# Altium footprint library SparkFun.PCBLIB: 674 footprints (part 38 of 44)
Each footprint in its own frame and in the unit in brackets; x right, y up, seen from the top. Pads: shape width x height; smd on the part's side, far side on the other; paste and mask are expansions set on the pad; w line width, h text height; cw(c..) or ccw(c..) is an arc to the next point about the centre after c.
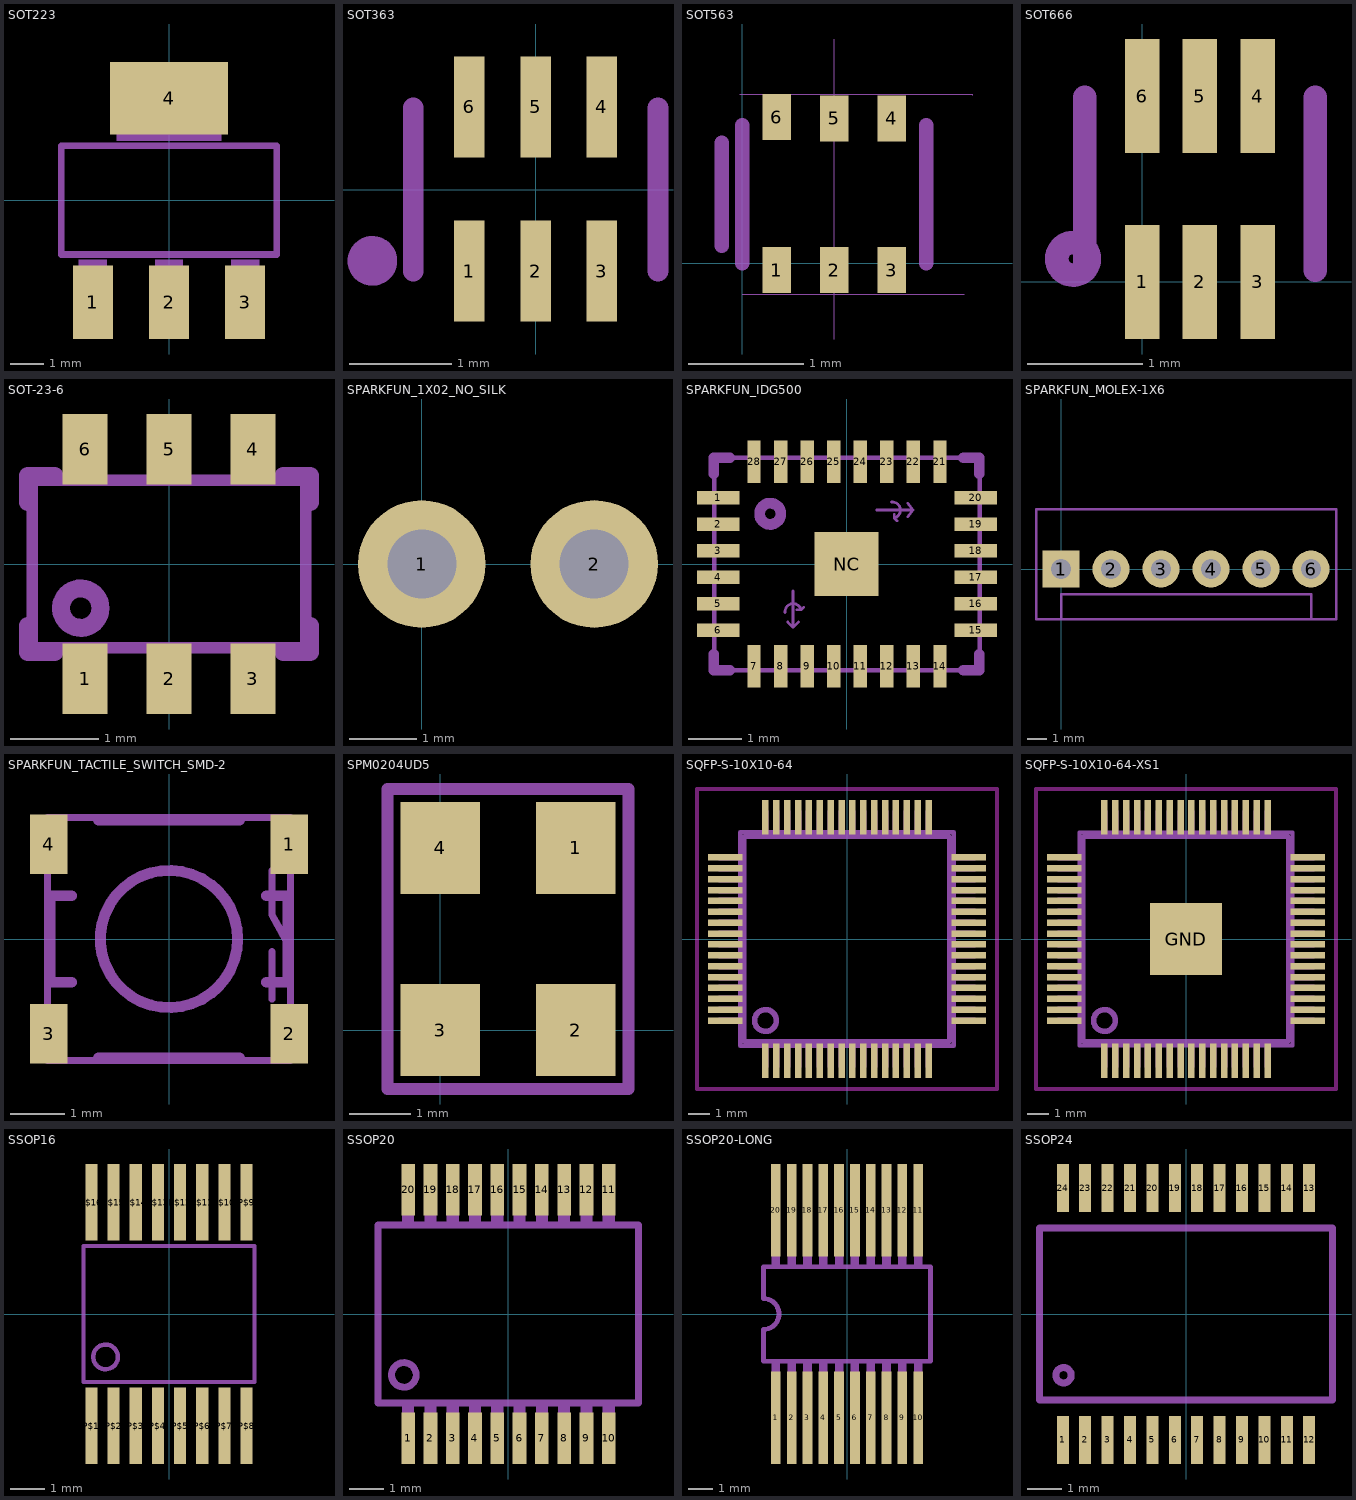
[diagram p37: the footprints below, top view; thin cyan lines are the x and y axes]

## SOT223 [mil]
pads (4):
  rect 48x88 smd: 1(-91,-122) 2(0,-122) 3(91,-122)
  rect 141.73x86.61 smd: 4(0,122.01)
Mechanical 2:
  lines w8: -129,-65 129,-65 129,65 -129,65 -129,-65
Mechanical 18:
  rectangle: -63,71 63,144
  rectangle: -17,-144 17,-71
  rectangle: -108,-144 -74,-71
  rectangle: 74,-144 108,-71
  rectangle: -63,71 63,144
  rectangle: -17,-144 17,-71
  rectangle: -108,-144 -74,-71
  rectangle: 74,-144 108,-71

## SOT363 [mm]
pads (6):
  rect 0.3x0.99 smd: 1(-0.65,-0.8) 2(0,-0.8) 3(0.65,-0.8) 4(0.65,0.81) 5(0,0.81) 6(-0.65,0.81)
Mechanical 2:
  circle w0.203: c-1.6,-0.7 r0.141
  lines w0.127: -1.6,-0.7 -1.5,-0.7 -1.5,-0.8
  lines w0.203: -1.2,-0.8 -1.2,0.8 ; 1.2,-0.8 1.2,0.8

## SOT563 [mil]
pads (6):
  rect 9.84x15.75 smd: 1(11.81,-2.36) 2(31.5,-2.36) 3(51.18,-2.36) 4(51.18,49.61) 5(31.5,49.61) 6(11.81,50)
Mechanical 2:
  lines w5: -7,6 -7,41.24 ; 0,0 0,47.24 ; 62.99,0 62.99,47.24
Mechanical 18:
  lines w0.39: -0.79,57.87 78.74,57.87 78.74,57.48 ; 0,-10.63 75.98,-10.63 ; 31.5,-25.98 31.5,76.77

## SOT666 [mm]
pads (6):
  rect 0.3x0.99 smd: 1(0,0) 2(0.5,0) 3(1,0) 4(1,1.61) 5(0.5,1.61) 6(0,1.61)
Mechanical 2:
  circle w0.203: c-0.6,0.2 r0.141
  lines w0.203: -0.5,0.1 -0.5,1.6 ; 1.5,0.1 1.5,1.6

## SOT-23-6 [mil]
pads (6):
  rect 20.08x31.5 smd: 1(-37.4,-51.18) 2(0,-51.18) 3(37.4,-51.18) 4(37.4,51.18) 5(0,51.18) 6(-37.4,51.18)
Mechanical 2:
  circle w8: c-39.37,-19.69 r8.8
  lines w8: -62.99,-27.56 -62.99,-39.37 -51.18,-39.37 ; -62.99,27.56 -62.99,39.37 -51.18,39.37 ; 51.18,-39.37 62.99,-39.37 62.99,-27.56 ; 51.18,39.37 62.99,39.37 62.99,27.56
Mechanical 18:
  lines w5: -61.02,-37.4 -61.02,37.4 61.02,37.4 61.02,-37.4 -61.02,-37.4

## SPARKFUN_1X02_NO_SILK [mil]
pads (2):
  round 74 hole 40: 1(0,0) 2(100,0)
Mechanical 18:
  rectangle: 90,-10 110,10
  rectangle: -10,-10 10,10

## SPARKFUN_IDG500 [mil]
pads (29):
  rect 31.5x9.84 smd: 1(-95.16,49.21) 2(-95.16,29.53) 3(-95.16,9.84) 4(-95.16,-9.84) 5(-95.16,-29.53) 6(-95.16,-49.21) 15(95.79,-49.21) 16(95.79,-29.53) 17(95.79,-9.84) 18(95.79,9.84) 19(95.79,29.53) 20(95.79,49.21)
  rect 9.84x31.5 smd: 7(-68.58,-75.79) 8(-48.9,-75.79) 9(-29.21,-75.79) 10(-9.53,-75.79) 11(10.16,-75.79) 12(29.84,-75.79) 13(49.53,-75.79) 14(69.21,-75.79) 21(69.21,75.79) 22(49.53,75.79) 23(29.84,75.79) 24(10.16,75.79) 25(-9.53,75.79) 26(-29.21,75.79) 27(-48.9,75.79) 28(-68.58,75.79)
  rect 47.24x47.24 smd paste-23.62 mask-23.62: NC(0,0)
Top Paste:
  rectangle: -7.87,-7.87 7.87,7.87
Top Solder:
  rectangle: -23.62,-23.62 23.62,23.62
Mechanical 2:
  circle w8: c-56.61,37.24 r7.87
  lines w8: -98.43,-66.93 -98.43,-78.74 -86.61,-78.74 ; -98.43,66.93 -98.43,78.74 -86.61,78.74 ; 86.61,-78.74 98.43,-78.74 98.43,-66.93 ; 86.61,78.74 98.43,78.74 98.43,66.93
Mechanical 18:
  circle w3.54: c-56.61,37.24 r7.87
  lines w2: -45.69,-36 cw(c-39.61,-35.5) -33.69,-34 ; -43.69,-43 -39.69,-47 ; -39.69,-20 -39.69,-47 ; -36.69,-34 -33.69,-34 ; -35.69,-43 -39.69,-47 ; -31.69,-32 -33.69,-34 ; 22.32,40 49.32,40 ; 33.32,46 cw(c33.82,39.92) 35.32,34 ; 35.32,37 35.32,34 ; 37.32,32 35.32,34 ; 45.32,35 49.32,40 ; 45.32,45 49.32,40
  lines w3.54: -98.11,-78.74 98.74,-78.74 98.74,78.74 -98.11,78.74 -98.11,-78.74

## SPARKFUN_MOLEX-1X6 [mil]
pads (6):
  rect 74x74 hole 40: 1(0,0)
  round 74 hole 40: 2(100,0) 3(200,0) 4(300,0) 5(400,0) 6(500,0)
Mechanical 2:
  lines w5: 0,-100 500,-100 ; 0,-100 -50,-100 -50,120 550,120 550,-100 500,-100 ; 0,-100 0,-50 500,-50 500,-100

## SPARKFUN_TACTILE_SWITCH_SMD-2 [mil]
pads (4):
  rect 27.56x43.31 smd: 1(87.6,68.9) 2(87.6,-68.9) 3(-87.6,-68.9) 4(-87.6,68.9)
Mechanical 2:
  circle w8: c0,0 r50
  lines w8: -70.87,-31.5 -86.61,-31.5 -86.61,31.5 -70.87,31.5 ; -51.18,-86.61 51.18,-86.61 ; -51.18,86.61 51.18,86.61 ; 70.87,-31.5 86.61,-31.5 86.61,31.5 70.87,31.5
Mechanical 18:
  lines w5: 75,-43.9 75,-9.06 ; 75,50 75,17.52 85.04,-0.39 ; -88.58,-88.58 88.58,-88.58 88.58,88.58 -88.58,88.58 -88.58,-88.58

## SPM0204UD5 [mil]
pads (4):
  rect 51.18x59.06 smd: 1(87.01,116.93) 2(87.01,0) 3(0,0) 4(0,116.93)
Mechanical 2:
  lines w7.87: -33.86,-37.8 -33.86,154.72 120.87,154.72 120.87,-37.8 -33.86,-37.8

## SQFP-S-10X10-64 [mil]
pads (64):
  rect 11.81x62.99 smd paste-31.5: 1(-147.64,-220.47) 2(-127.95,-220.47) 3(-108.27,-220.47) 4(-88.58,-220.47) 5(-68.9,-220.47) 6(-49.21,-220.47) 7(-29.53,-220.47) 8(-9.84,-220.47) 9(9.84,-220.47) 10(29.53,-220.47) 11(49.21,-220.47) 12(68.9,-220.47) 13(88.58,-220.47) 14(108.27,-220.47) 15(127.95,-220.47) 16(147.64,-220.47) 33(147.64,220.47) 34(127.95,220.47) 35(108.27,220.47) 36(88.58,220.47) 37(68.9,220.47) 38(49.21,220.47) 39(29.53,220.47) 40(9.84,220.47) 41(-9.84,220.47) 42(-29.53,220.47) 43(-49.21,220.47) 44(-68.9,220.47) 45(-88.58,220.47) 46(-108.27,220.47) 47(-127.95,220.47) 48(-147.64,220.47)
  rect 62.99x11.81 smd paste-31.5: 17(220.47,-147.64) 18(220.47,-127.95) 19(220.47,-108.27) 20(220.47,-88.58) 21(220.47,-68.9) 22(220.47,-49.21) 23(220.47,-29.53) 24(220.47,-9.84) 25(220.47,9.84) 26(220.47,29.53) 27(220.47,49.21) 28(220.47,68.9) 29(220.47,88.58) 30(220.47,108.27) 31(220.47,127.95) 32(220.47,147.64) 49(-220.47,147.64) 50(-220.47,127.95) 51(-220.47,108.27) 52(-220.47,88.58) 53(-220.47,68.9) 54(-220.47,49.21) 55(-220.47,29.53) 56(-220.47,9.84) 57(-220.47,-9.84) 58(-220.47,-29.53) 59(-220.47,-49.21) 60(-220.47,-68.9) 61(-220.47,-88.58) 62(-220.47,-108.27) 63(-220.47,-127.95) 64(-220.47,-147.64)
Top Paste:
  rectangle: -238.9,142.3 -198.7,153
  rectangle: -248.3,122.6 -208.1,133.3
  rectangle: -238.9,102.9 -198.7,113.6
  rectangle: -248.3,83.2 -208.1,93.9
  rectangle: -238.9,63.6 -198.7,74.3
  rectangle: -248.3,43.9 -208.1,54.6
  rectangle: -238.9,24.4 -198.7,35.1
  rectangle: -248.3,4.7 -208.1,15.4
  rectangle: -238.9,-15.2 -198.7,-4.5
  rectangle: -248.3,-34.9 -208.1,-24.2
  rectangle: -238.9,-54.5 -198.7,-43.8
  rectangle: -248.3,-74.2 -208.1,-63.5
  rectangle: -238.9,-93.9 -198.7,-83.2
  rectangle: -248.3,-113.6 -208.1,-102.9
  rectangle: -238.9,-133.2 -198.7,-122.5
  rectangle: -248.3,-152.9 -208.1,-142.2
  rectangle: 208.2,142.2 248.4,152.9
  rectangle: 198.8,122.5 239,133.2
  rectangle: 208.2,102.8 248.4,113.5
  rectangle: 198.8,83.1 239,93.8
  rectangle: 208.2,63.5 248.4,74.2
  rectangle: 198.8,43.8 239,54.5
  rectangle: 208.2,24.3 248.4,35
  rectangle: 198.8,4.6 239,15.3
  rectangle: 208.2,-15.3 248.4,-4.6
  rectangle: 198.8,-35 239,-24.3
  rectangle: 208.2,-54.6 248.4,-43.9
  rectangle: 198.8,-74.3 239,-63.6
  rectangle: 208.2,-94 248.4,-83.3
  rectangle: 198.8,-113.7 239,-103
  rectangle: 208.2,-133.3 248.4,-122.6
  rectangle: 198.8,-153 239,-142.3
  region: -142.2,208.4 -142.2,248.6 -152.9,248.6 -152.9,208.4
  region: -122.5,199 -122.5,239.2 -133.2,239.2 -133.2,199
  region: -102.8,208.4 -102.8,248.6 -113.5,248.6 -113.5,208.4
  region: -83.1,199 -83.1,239.2 -93.8,239.2 -93.8,199
  region: -63.5,208.4 -63.5,248.6 -74.2,248.6 -74.2,208.4
  region: -43.8,199 -43.8,239.2 -54.5,239.2 -54.5,199
  region: -24.3,208.4 -24.3,248.6 -35,248.6 -35,208.4
  region: -4.6,199 -4.6,239.2 -15.3,239.2 -15.3,199
  region: 15.3,208.4 15.3,248.6 4.6,248.6 4.6,208.4
  region: 35,199 35,239.2 24.3,239.2 24.3,199
  region: 54.6,208.4 54.6,248.6 43.9,248.6 43.9,208.4
  region: 74.3,199 74.3,239.2 63.6,239.2 63.6,199
  region: 94,208.4 94,248.6 83.3,248.6 83.3,208.4
  region: 113.7,199 113.7,239.2 103,239.2 103,199
  region: 133.3,208.4 133.3,248.6 122.6,248.6 122.6,208.4
  region: 153,199 153,239.2 142.3,239.2 142.3,199
  region: -142.3,-237.5 -142.3,-197.3 -153,-197.3 -153,-237.5
  region: -122.6,-246.9 -122.6,-206.7 -133.3,-206.7 -133.3,-246.9
  region: -102.9,-237.5 -102.9,-197.3 -113.6,-197.3 -113.6,-237.5
  region: -83.2,-246.9 -83.2,-206.7 -93.9,-206.7 -93.9,-246.9
  region: -63.6,-237.5 -63.6,-197.3 -74.3,-197.3 -74.3,-237.5
  region: -43.9,-246.9 -43.9,-206.7 -54.6,-206.7 -54.6,-246.9
  region: -24.4,-237.5 -24.4,-197.3 -35.1,-197.3 -35.1,-237.5
  region: -4.7,-246.9 -4.7,-206.7 -15.4,-206.7 -15.4,-246.9
  region: 15.2,-237.5 15.2,-197.3 4.5,-197.3 4.5,-237.5
  region: 34.9,-246.9 34.9,-206.7 24.2,-206.7 24.2,-246.9
  region: 54.5,-237.5 54.5,-197.3 43.8,-197.3 43.8,-237.5
  region: 74.2,-246.9 74.2,-206.7 63.5,-206.7 63.5,-246.9
  region: 93.9,-237.5 93.9,-197.3 83.2,-197.3 83.2,-237.5
  region: 113.6,-246.9 113.6,-206.7 102.9,-206.7 102.9,-246.9
  region: 133.2,-237.5 133.2,-197.3 122.5,-197.3 122.5,-237.5
  region: 152.9,-246.9 152.9,-206.7 142.2,-206.7 142.2,-246.9
Keep-Out Layer:
  lines w7.87: -271.65,-271.65 -271.65,271.65 271.65,271.65 271.65,-271.65 -271.65,-271.65
Mechanical 2:
  circle w10: c-147.64,-147.64 r19.69
  lines w8: -185.83,-185.43 185.43,-185.43 185.43,185.43 -185.83,185.43 -185.83,-185.43
Mechanical 18:
  rectangle: -153.54,-232.28 -141.73,-194.88
  rectangle: -133.86,-232.28 -122.05,-194.88
  rectangle: -114.17,-232.28 -102.36,-194.88
  rectangle: -94.49,-232.28 -82.68,-194.88
  rectangle: -74.8,-232.28 -62.99,-194.88
  rectangle: -55.12,-232.28 -43.31,-194.88
  rectangle: -35.43,-232.28 -23.62,-194.88
  rectangle: -15.75,-232.28 -3.94,-194.88
  rectangle: 3.94,-232.28 15.75,-194.88
  rectangle: 23.62,-232.28 35.43,-194.88
  rectangle: 43.31,-232.28 55.12,-194.88
  rectangle: 62.99,-232.28 74.8,-194.88
  rectangle: 82.68,-232.28 94.49,-194.88
  rectangle: 102.36,-232.28 114.17,-194.88
  rectangle: 122.05,-232.28 133.86,-194.88
  rectangle: 141.73,-232.28 153.54,-194.88
  rectangle: 194.88,-153.54 232.28,-141.73
  rectangle: 194.88,-133.86 232.28,-122.05
  rectangle: 194.88,-114.17 232.28,-102.36
  rectangle: 194.88,-94.49 232.28,-82.68
  rectangle: 194.88,-74.8 232.28,-62.99
  rectangle: 194.88,-55.12 232.28,-43.31
  rectangle: 194.88,-35.43 232.28,-23.62
  rectangle: 194.88,-15.75 232.28,-3.94
  rectangle: 194.88,3.94 232.28,15.75
  rectangle: 194.88,23.62 232.28,35.43
  rectangle: 194.88,43.31 232.28,55.12
  rectangle: 194.88,62.99 232.28,74.8
  rectangle: 194.88,82.68 232.28,94.49
  rectangle: 194.88,102.36 232.28,114.17
  rectangle: 194.88,122.05 232.28,133.86
  rectangle: 194.88,141.73 232.28,153.54
  rectangle: 141.73,194.88 153.54,232.28
  rectangle: 122.05,194.88 133.86,232.28
  rectangle: 102.36,194.88 114.17,232.28
  rectangle: 82.68,194.88 94.49,232.28
  rectangle: 62.99,194.88 74.8,232.28
  rectangle: 43.31,194.88 55.12,232.28
  rectangle: 23.62,194.88 35.43,232.28
  rectangle: 3.94,194.88 15.75,232.28
  rectangle: -15.75,194.88 -3.94,232.28
  rectangle: -35.43,194.88 -23.62,232.28
  rectangle: -55.12,194.88 -43.31,232.28
  rectangle: -74.8,194.88 -62.99,232.28
  rectangle: -94.49,194.88 -82.68,232.28
  rectangle: -114.17,194.88 -102.36,232.28
  rectangle: -133.86,194.88 -122.05,232.28
  rectangle: -153.54,194.88 -141.73,232.28
  rectangle: -232.28,141.73 -194.88,153.54
  rectangle: -232.28,122.05 -194.88,133.86
  rectangle: -232.28,102.36 -194.88,114.17
  rectangle: -232.28,82.68 -194.88,94.49
  rectangle: -232.28,62.99 -194.88,74.8
  rectangle: -232.28,43.31 -194.88,55.12
  rectangle: -232.28,23.62 -194.88,35.43
  rectangle: -232.28,3.94 -194.88,15.75
  rectangle: -232.28,-15.75 -194.88,-3.94
  rectangle: -232.28,-35.43 -194.88,-23.62
  rectangle: -232.28,-55.12 -194.88,-43.31
  rectangle: -232.28,-74.8 -194.88,-62.99
  rectangle: -232.28,-94.49 -194.88,-82.68
  rectangle: -232.28,-114.17 -194.88,-102.36
  rectangle: -232.28,-133.86 -194.88,-122.05
  rectangle: -232.28,-153.54 -194.88,-141.73
  lines w8: -193.31,-193.31 193.31,-193.31 193.31,193.31 -193.31,193.31 -193.31,-193.31

## SQFP-S-10X10-64-XS1 [mil]
pads (65):
  rect 11.81x62.99 smd paste-31.5: 1(-147.64,-220.47) 2(-127.95,-220.47) 3(-108.27,-220.47) 4(-88.58,-220.47) 5(-68.9,-220.47) 6(-49.21,-220.47) 7(-29.53,-220.47) 8(-9.84,-220.47) 9(9.84,-220.47) 10(29.53,-220.47) 11(49.21,-220.47) 12(68.9,-220.47) 13(88.58,-220.47) 14(108.27,-220.47) 15(127.95,-220.47) 16(147.64,-220.47) 33(147.64,220.47) 34(127.95,220.47) 35(108.27,220.47) 36(88.58,220.47) 37(68.9,220.47) 38(49.21,220.47) 39(29.53,220.47) 40(9.84,220.47) 41(-9.84,220.47) 42(-29.53,220.47) 43(-49.21,220.47) 44(-68.9,220.47) 45(-88.58,220.47) 46(-108.27,220.47) 47(-127.95,220.47) 48(-147.64,220.47)
  rect 62.99x11.81 smd paste-31.5: 17(220.47,-147.64) 18(220.47,-127.95) 19(220.47,-108.27) 20(220.47,-88.58) 21(220.47,-68.9) 22(220.47,-49.21) 23(220.47,-29.53) 24(220.47,-9.84) 25(220.47,9.84) 26(220.47,29.53) 27(220.47,49.21) 28(220.47,68.9) 29(220.47,88.58) 30(220.47,108.27) 31(220.47,127.95) 32(220.47,147.64) 49(-220.47,147.64) 50(-220.47,127.95) 51(-220.47,108.27) 52(-220.47,88.58) 53(-220.47,68.9) 54(-220.47,49.21) 55(-220.47,29.53) 56(-220.47,9.84) 57(-220.47,-9.84) 58(-220.47,-29.53) 59(-220.47,-49.21) 60(-220.47,-68.9) 61(-220.47,-88.58) 62(-220.47,-108.27) 63(-220.47,-127.95) 64(-220.47,-147.64)
  rect 129.92x129.92 smd: GND(0,0)
Top Paste:
  rectangle: -238.9,142.3 -198.7,153
  rectangle: -248.3,122.6 -208.1,133.3
  rectangle: -238.9,102.9 -198.7,113.6
  rectangle: -248.3,83.2 -208.1,93.9
  rectangle: -238.9,63.6 -198.7,74.3
  rectangle: -248.3,43.9 -208.1,54.6
  rectangle: -238.9,24.4 -198.7,35.1
  rectangle: -248.3,4.7 -208.1,15.4
  rectangle: -238.9,-15.2 -198.7,-4.5
  rectangle: -248.3,-34.9 -208.1,-24.2
  rectangle: -238.9,-54.5 -198.7,-43.8
  rectangle: -248.3,-74.2 -208.1,-63.5
  rectangle: -238.9,-93.9 -198.7,-83.2
  rectangle: -248.3,-113.6 -208.1,-102.9
  rectangle: -238.9,-133.2 -198.7,-122.5
  rectangle: -248.3,-152.9 -208.1,-142.2
  rectangle: 208.2,142.2 248.4,152.9
  rectangle: 198.8,122.5 239,133.2
  rectangle: 208.2,102.8 248.4,113.5
  rectangle: 198.8,83.1 239,93.8
  rectangle: 208.2,63.5 248.4,74.2
  rectangle: 198.8,43.8 239,54.5
  rectangle: 208.2,24.3 248.4,35
  rectangle: 198.8,4.6 239,15.3
  rectangle: 208.2,-15.3 248.4,-4.6
  rectangle: 198.8,-35 239,-24.3
  rectangle: 208.2,-54.6 248.4,-43.9
  rectangle: 198.8,-74.3 239,-63.6
  rectangle: 208.2,-94 248.4,-83.3
  rectangle: 198.8,-113.7 239,-103
  rectangle: 208.2,-133.3 248.4,-122.6
  rectangle: 198.8,-153 239,-142.3
  region: -142.2,208.4 -142.2,248.6 -152.9,248.6 -152.9,208.4
  region: -122.5,199 -122.5,239.2 -133.2,239.2 -133.2,199
  region: -102.8,208.4 -102.8,248.6 -113.5,248.6 -113.5,208.4
  region: -83.1,199 -83.1,239.2 -93.8,239.2 -93.8,199
  region: -63.5,208.4 -63.5,248.6 -74.2,248.6 -74.2,208.4
  region: -43.8,199 -43.8,239.2 -54.5,239.2 -54.5,199
  region: -24.3,208.4 -24.3,248.6 -35,248.6 -35,208.4
  region: -4.6,199 -4.6,239.2 -15.3,239.2 -15.3,199
  region: 15.3,208.4 15.3,248.6 4.6,248.6 4.6,208.4
  region: 35,199 35,239.2 24.3,239.2 24.3,199
  region: 54.6,208.4 54.6,248.6 43.9,248.6 43.9,208.4
  region: 74.3,199 74.3,239.2 63.6,239.2 63.6,199
  region: 94,208.4 94,248.6 83.3,248.6 83.3,208.4
  region: 113.7,199 113.7,239.2 103,239.2 103,199
  region: 133.3,208.4 133.3,248.6 122.6,248.6 122.6,208.4
  region: 153,199 153,239.2 142.3,239.2 142.3,199
  region: -142.3,-237.5 -142.3,-197.3 -153,-197.3 -153,-237.5
  region: -122.6,-246.9 -122.6,-206.7 -133.3,-206.7 -133.3,-246.9
  region: -102.9,-237.5 -102.9,-197.3 -113.6,-197.3 -113.6,-237.5
  region: -83.2,-246.9 -83.2,-206.7 -93.9,-206.7 -93.9,-246.9
  region: -63.6,-237.5 -63.6,-197.3 -74.3,-197.3 -74.3,-237.5
  region: -43.9,-246.9 -43.9,-206.7 -54.6,-206.7 -54.6,-246.9
  region: -24.4,-237.5 -24.4,-197.3 -35.1,-197.3 -35.1,-237.5
  region: -4.7,-246.9 -4.7,-206.7 -15.4,-206.7 -15.4,-246.9
  region: 15.2,-237.5 15.2,-197.3 4.5,-197.3 4.5,-237.5
  region: 34.9,-246.9 34.9,-206.7 24.2,-206.7 24.2,-246.9
  region: 54.5,-237.5 54.5,-197.3 43.8,-197.3 43.8,-237.5
  region: 74.2,-246.9 74.2,-206.7 63.5,-206.7 63.5,-246.9
  region: 93.9,-237.5 93.9,-197.3 83.2,-197.3 83.2,-237.5
  region: 113.6,-246.9 113.6,-206.7 102.9,-206.7 102.9,-246.9
  region: 133.2,-237.5 133.2,-197.3 122.5,-197.3 122.5,-237.5
  region: 152.9,-246.9 152.9,-206.7 142.2,-206.7 142.2,-246.9
Keep-Out Layer:
  lines w7.87: -271.65,-271.65 -271.65,271.65 271.65,271.65 271.65,-271.65 -271.65,-271.65
Mechanical 2:
  circle w10: c-147.64,-147.64 r19.69
  lines w8: -185.83,-185.43 185.43,-185.43 185.43,185.43 -185.83,185.43 -185.83,-185.43
Mechanical 18:
  rectangle: -232.28,82.68 -188.98,94.49
  rectangle: -232.28,102.36 -188.98,114.17
  rectangle: -232.28,141.73 -188.98,153.54
  rectangle: -232.28,122.05 -188.98,133.86
  rectangle: -232.28,3.94 -188.98,15.75
  rectangle: -232.28,23.62 -188.98,35.43
  rectangle: -232.28,62.99 -188.98,74.8
  rectangle: -232.28,43.31 -188.98,55.12
  rectangle: -232.28,-74.8 -188.98,-62.99
  rectangle: -232.28,-55.12 -188.98,-43.31
  rectangle: -232.28,-15.75 -188.98,-3.94
  rectangle: -232.28,-35.43 -188.98,-23.62
  rectangle: -232.28,-153.54 -188.98,-141.73
  rectangle: -232.28,-133.86 -188.98,-122.05
  rectangle: -232.28,-94.49 -188.98,-82.68
  rectangle: -232.28,-114.17 -188.98,-102.36
  region: -82.68,-232.28 -82.68,-188.97 -94.5,-188.97 -94.5,-232.28
  region: -102.35,-232.28 -102.35,-188.97 -114.17,-188.97 -114.17,-232.28
  region: -141.72,-232.28 -141.72,-188.97 -153.54,-188.97 -153.54,-232.28
  region: -122.05,-232.28 -122.05,-188.97 -133.87,-188.97 -133.87,-232.28
  region: -3.94,-232.28 -3.94,-188.97 -15.75,-188.97 -15.75,-232.28
  region: -23.62,-232.28 -23.62,-188.97 -35.43,-188.97 -35.43,-232.28
  region: -62.98,-232.28 -62.98,-188.97 -74.8,-188.97 -74.8,-232.28
  region: -43.31,-232.28 -43.31,-188.97 -55.12,-188.97 -55.12,-232.28
  region: 74.8,-232.28 74.8,-188.97 62.98,-188.97 62.98,-232.28
  region: 55.12,-232.28 55.12,-188.97 43.31,-188.97 43.31,-232.28
  region: 15.75,-232.28 15.75,-188.97 3.94,-188.97 3.94,-232.28
  region: 35.43,-232.28 35.43,-188.97 23.62,-188.97 23.62,-232.28
  region: 153.54,-232.28 153.54,-188.97 141.72,-188.97 141.72,-232.28
  region: 133.87,-232.28 133.87,-188.97 122.05,-188.97 122.05,-232.28
  region: 94.5,-232.28 94.5,-188.97 82.68,-188.97 82.68,-232.28
  region: 114.17,-232.28 114.17,-188.97 102.35,-188.97 102.35,-232.28
  rectangle: 188.98,82.68 232.28,94.49
  rectangle: 188.98,102.36 232.28,114.17
  rectangle: 188.98,141.73 232.28,153.54
  rectangle: 188.98,122.05 232.28,133.86
  rectangle: 188.98,3.94 232.28,15.75
  rectangle: 188.98,23.62 232.28,35.43
  rectangle: 188.98,62.99 232.28,74.8
  rectangle: 188.98,43.31 232.28,55.12
  rectangle: 188.98,-74.8 232.28,-62.99
  rectangle: 188.98,-55.12 232.28,-43.31
  rectangle: 188.98,-15.75 232.28,-3.94
  rectangle: 188.98,-35.43 232.28,-23.62
  rectangle: 188.98,-153.54 232.28,-141.73
  rectangle: 188.98,-133.86 232.28,-122.05
  rectangle: 188.98,-94.49 232.28,-82.68
  rectangle: 188.98,-114.17 232.28,-102.36
  region: -82.68,188.97 -82.68,232.28 -94.5,232.28 -94.5,188.97
  region: -102.35,188.97 -102.35,232.28 -114.17,232.28 -114.17,188.97
  region: -141.72,188.97 -141.72,232.28 -153.54,232.28 -153.54,188.97
  region: -122.05,188.97 -122.05,232.28 -133.87,232.28 -133.87,188.97
  region: -3.94,188.97 -3.94,232.28 -15.75,232.28 -15.75,188.97
  region: -23.62,188.97 -23.62,232.28 -35.43,232.28 -35.43,188.97
  region: -62.98,188.97 -62.98,232.28 -74.8,232.28 -74.8,188.97
  region: -43.31,188.97 -43.31,232.28 -55.12,232.28 -55.12,188.97
  region: 74.8,188.97 74.8,232.28 62.98,232.28 62.98,188.97
  region: 55.12,188.97 55.12,232.28 43.31,232.28 43.31,188.97
  region: 15.75,188.97 15.75,232.28 3.94,232.28 3.94,188.97
  region: 35.43,188.97 35.43,232.28 23.62,232.28 23.62,188.97
  region: 153.54,188.97 153.54,232.28 141.72,232.28 141.72,188.97
  region: 133.87,188.97 133.87,232.28 122.05,232.28 122.05,188.97
  region: 94.5,188.97 94.5,232.28 82.68,232.28 82.68,188.97
  region: 114.17,188.97 114.17,232.28 102.35,232.28 102.35,188.97
  lines w5: -192.91,188.98 -192.91,192.91
  lines w8: -192.91,-192.91 -192.91,192.91 192.91,192.91 192.91,-192.91 -192.91,-192.91

## SSOP16 [mil]
pads (16):
  rect 13.78x86.61 smd: P$1(-87.5,-125.98) P$2(-62.5,-125.98) P$3(-37.5,-125.98) P$4(-12.5,-125.98) P$5(12.5,-125.98) P$6(37.5,-125.98) P$7(62.5,-125.98) P$8(87.5,-125.98) P$9(87.5,125.98) P$10(62.5,125.98) P$11(37.5,125.98) P$12(12.5,125.98) P$13(-12.5,125.98) P$14(-37.5,125.98) P$15(-62.5,125.98) P$16(-87.5,125.98)
Mechanical 2:
  circle w5: c-71.65,-48.43 r13.93
  lines w5: -96.46,-76.77 96.46,-76.77 96.46,76.77 -96.46,76.77 -96.46,-76.77

## SSOP20 [mil]
pads (20):
  rect 15.75x59.06 smd: 1(-115.16,-142.72) 2(-89.57,-142.72) 3(-63.98,-142.72) 4(-38.39,-142.72) 5(-12.8,-142.72) 6(12.8,-142.72) 7(38.39,-142.72) 8(63.98,-142.72) 9(89.57,-142.72) 10(115.16,-142.72) 11(115.16,142.72) 12(89.57,142.72) 13(63.98,142.72) 14(38.39,142.72) 15(12.8,142.72) 16(-12.8,142.72) 17(-38.39,142.72) 18(-63.98,142.72) 19(-89.57,142.72) 20(-115.16,142.72)
Mechanical 2:
  circle w8: c-120,-70 r14.14
  lines w5: -150.59,101.38 -149.61,101.38
  lines w8: -149.61,101.38 -149.61,-102.36 149.61,-102.36 149.61,102.36 -149.61,102.36
Mechanical 18:
  rectangle: -122.16,-155 -108.16,-104
  rectangle: -96.57,-155 -82.57,-104
  rectangle: -70.98,-155 -56.98,-104
  rectangle: -45.39,-155 -31.39,-104
  rectangle: -19.8,-155 -5.8,-104
  rectangle: 5.79,-155 19.79,-104
  rectangle: 31.38,-155 45.38,-104
  rectangle: 56.98,-155 70.98,-104
  rectangle: 82.57,-155 96.57,-104
  rectangle: 108.16,-155 122.16,-104
  rectangle: 108.15,104 122.15,155
  rectangle: 82.56,104 96.56,155
  rectangle: 56.97,104 70.97,155
  rectangle: 31.39,104 45.39,155
  rectangle: 5.8,104 19.8,155
  rectangle: -19.79,104 -5.79,155
  rectangle: -45.38,104 -31.38,155
  rectangle: -70.97,104 -56.97,155
  rectangle: -96.56,104 -82.56,155
  rectangle: -122.15,104 -108.15,155

## SSOP20-LONG [mil]
pads (20):
  rect 15.75x150 smd: 1(-115.16,-167.72) 2(-89.57,-167.72) 3(-63.98,-167.72) 4(-38.39,-167.72) 5(-12.8,-167.72) 6(12.8,-167.72) 7(38.39,-167.72) 8(63.98,-167.72) 9(89.57,-167.72) 10(115.16,-167.72) 11(115.16,167.72) 12(89.57,167.72) 13(63.98,167.72) 14(38.39,167.72) 15(12.8,167.72) 16(-12.8,167.72) 17(-38.39,167.72) 18(-63.98,167.72) 19(-89.57,167.72) 20(-115.16,167.72)
Mechanical 2:
  lines w8: -135,-76.5 135,-76.5 135,76.5 -135,76.5 -135,25 cw(c-135,0) -135,-25 -135,-76.5
Mechanical 18:
  rectangle: -122.16,-130 -108.16,-79
  rectangle: -96.57,-130 -82.57,-79
  rectangle: -70.98,-130 -56.98,-79
  rectangle: -45.39,-130 -31.39,-79
  rectangle: -19.8,-130 -5.8,-79
  rectangle: 5.79,-130 19.79,-79
  rectangle: 31.38,-130 45.38,-79
  rectangle: 56.98,-130 70.98,-79
  rectangle: 82.57,-130 96.57,-79
  rectangle: 108.16,-130 122.16,-79
  rectangle: 108.15,79 122.15,130
  rectangle: 82.56,79 96.56,130
  rectangle: 56.97,79 70.97,130
  rectangle: 31.39,79 45.39,130
  rectangle: 5.8,79 19.8,130
  rectangle: -19.79,79 -5.79,130
  rectangle: -45.38,79 -31.38,130
  rectangle: -70.97,79 -56.97,130
  rectangle: -96.56,79 -82.56,130
  rectangle: -122.15,79 -108.15,130

## SSOP24 [mil]
pads (24):
  rect 13.7x55 smd: 1(-140.75,-143.94) 2(-115.16,-143.94) 3(-89.57,-143.94) 4(-63.98,-143.94) 5(-38.39,-143.94) 6(-12.8,-143.94) 7(12.8,-143.94) 8(38.39,-143.94) 9(63.98,-143.94) 10(89.57,-143.94) 11(115.16,-143.94) 12(140.75,-143.94) 13(140.75,143.94) 14(115.16,143.94) 15(89.57,143.94) 16(63.98,143.94) 17(38.39,143.94) 18(12.8,143.94) 19(-12.8,143.94) 20(-38.39,143.94) 21(-63.98,143.94) 22(-89.57,143.94) 23(-115.16,143.94) 24(-140.75,143.94)
Mechanical 2:
  circle w8: c-140,-70 r8.78
  lines w8: -167.32,-98.43 167.32,-98.43 167.32,98.43 -167.32,98.43 -167.32,-98.43